# Altium footprint library G103WM_newLib.PcbLib: 75 footprints (part 4 of 5)
Each footprint in its own frame and in the unit in brackets; x right, y up, seen from the top. Pads: shape width x height; smd on the part's side, far side on the other; paste and mask are expansions set on the pad; w line width, h text height; cw(c..) or ccw(c..) is an arc to the next point about the centre after c.
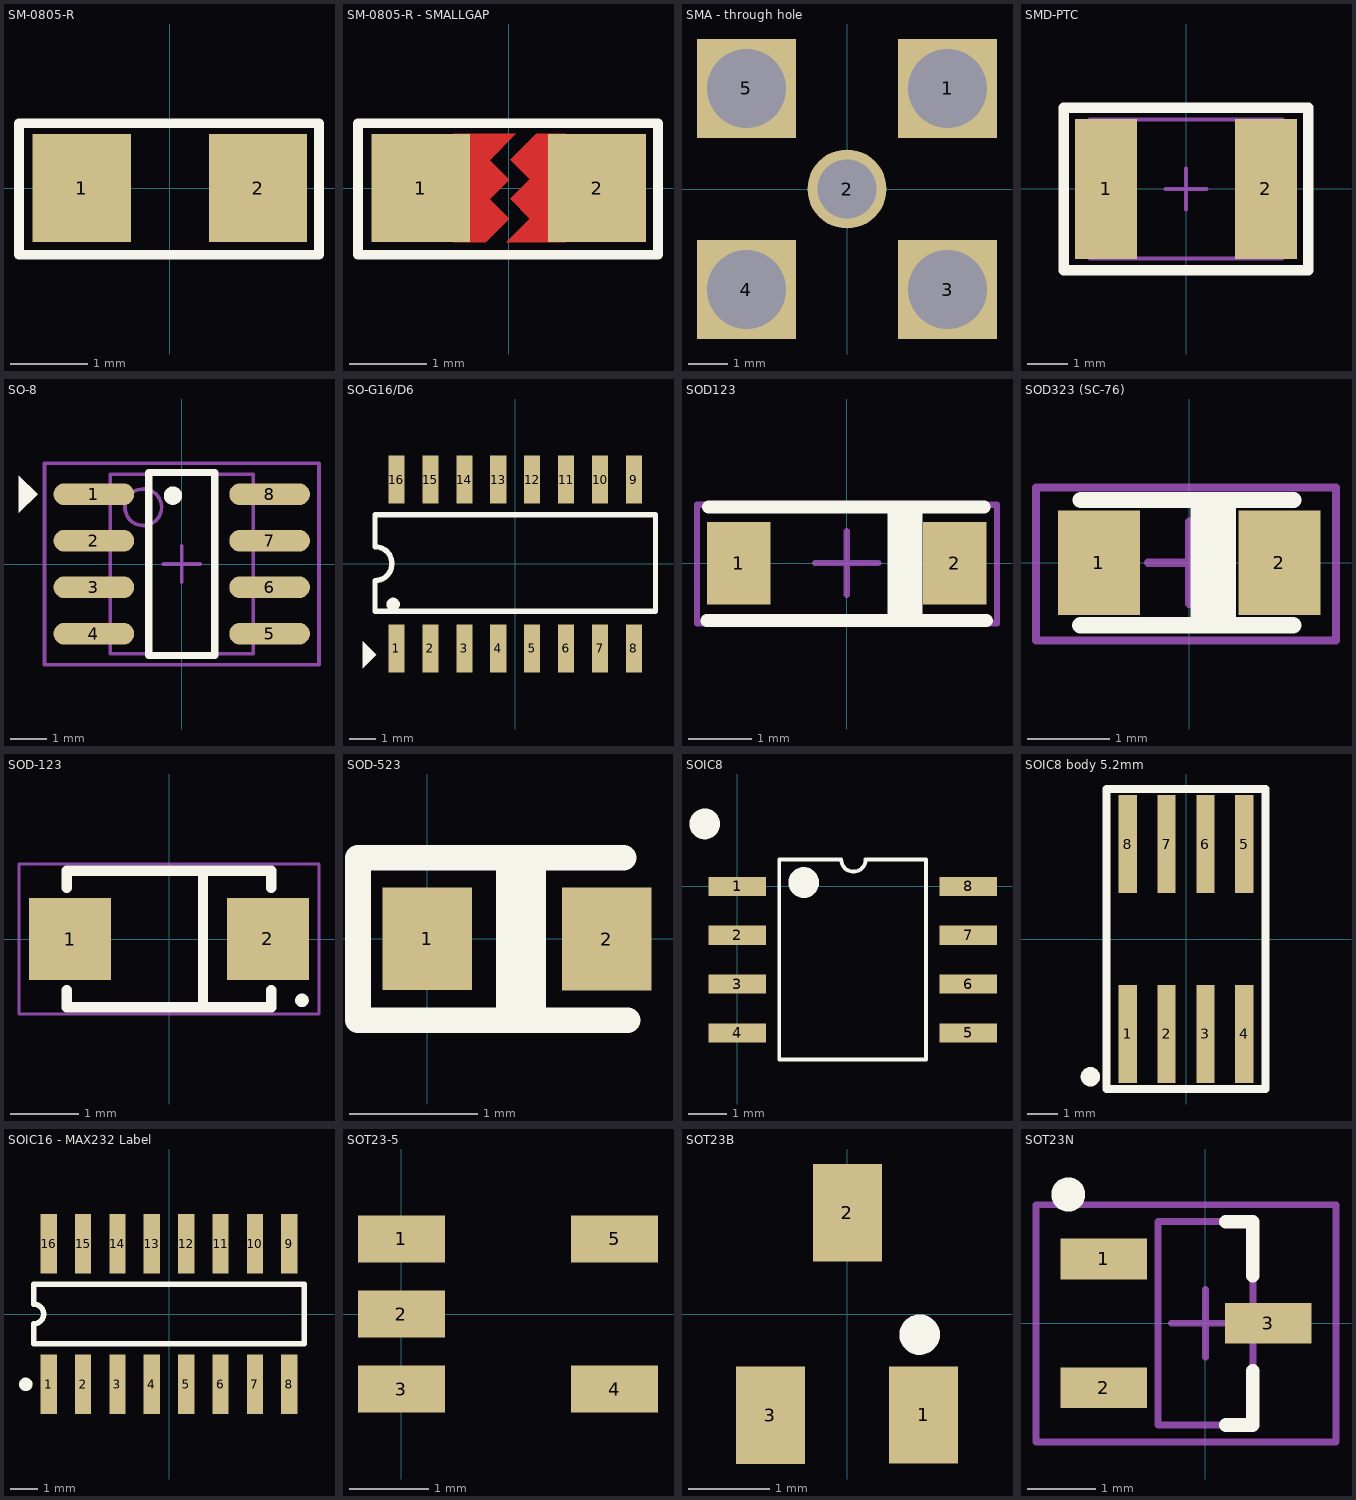
[diagram p3: the footprints below, top view; thin cyan lines are the x and y axes]

## SM-0805-R [mil] "Compoment SMD 80x50mil"
height 50
pads (2):
  rect 50x55 smd: 1(-45,0) 2(45,0)
Top Overlay:
  lines w5: -77,-34 -77,33 76,33 76,-34 -77,-34
3D body "User Library-0805 SMD Resistor.step": height 30.79, standoff 0, extent -39.36,-24.6 39.38,24.61

## SM-0805-R - SMALLGAP [mil] "Compoment SMD 80x50mil"
height 50
pads (2):
  rect 50x55 smd: 1(-45,0) 2(45,0)
Top Layer:
  region: -28.54,27.56 3.39,27.56 -9.92,14.25 0.08,4.25 -9.92,-5.75 0.08,-15.75 -11.73,-27.56 -28.54,-27.56
  region: 29,27.72 13.84,27.72 0.53,14.41 10.53,4.41 0.53,-5.59 10.53,-15.59 -1.44,-27.56 29,-27.56
Top Overlay:
  lines w5: -77,-34 76,-34 76,33 -77,33 -77,-34
3D body "User Library-0805 SMD Resistor.step": height 30.79, standoff 0, extent -39.36,-24.6 39.38,24.61

## SMA - through hole [mm]
pads (5):
  rect 2.5x2.5 hole 2: 1(2.54,2.54) 3(2.54,-2.54) 4(-2.54,-2.54) 5(-2.54,2.54)
  round 2 hole 1.5: 2(0,0)
3D body "SMA-J-P-H-ST-TH1.STEP": height 11.6, standoff -1.87, extent -3.444,-3.5 3.556,3.5

## SMD-PTC [mm]
height 0.7
pads (2):
  rect 1.52x3.44 smd: 1(-1.965,0) 2(1.965,0)
Top Overlay:
  lines w0.254: -3,-2 -3,2 3,2 3,-2 -3,-2
Mechanical 13:
  lines w0.1: -2.365,-1.705 -2.365,1.705 2.365,1.705 2.365,-1.705 -2.365,-1.705
Mechanical 15:
  lines w0.1: -0.5,0 0.5,0 ; 0,-0.5 0,0.5
3D body: height 0.7, standoff 0, extent -2.065,-1.705 2.065,1.705
3D body: height 0.7, standoff 0, extent -2.365,-1.705 -2.065,1.705
3D body: height 0.7, standoff 0, extent 2.065,-1.705 2.365,1.705

## SO-8 [mm] "8-Pin Small Outline Integrated Circuit 1.27 mm Pitch, IPC Medium Density"
height 1.75
pads (8):
  oval 2.2x0.6 smd: 1(-2.4,1.905) 2(-2.4,0.635) 3(-2.4,-0.635) 4(-2.4,-1.905) 5(2.4,-1.905) 6(2.4,-0.635) 7(2.4,0.635) 8(2.4,1.905)
Top Overlay:
  circle w0.25: c-0.241,1.866 r0.125
  region: -4.445,1.397 -3.937,1.905 -4.445,2.413
  lines w0.2: -0.9,-2.5 -0.9,2.5 0.9,2.5 0.9,-2.5 -0.9,-2.5
Mechanical 13:
  circle w0.1: c-1.05,1.55 r0.5
  lines w0.1: -1.95,-2.45 -1.95,2.45 1.95,2.45 1.95,-2.45 -1.95,-2.45
Mechanical 15:
  lines w0.1: -0.5,0 0.5,0 ; 0,-0.5 0,0.5 ; -3.75,-2.75 -3.75,2.75 3.75,2.75 3.75,-2.75 -3.75,-2.75
3D body "User Library-sop-8.STEP": height 1.6, standoff 0, extent -2.894,-2.51 3.148,2.51

## SO-G16/D6 [mm] "Small Outline; 16 Leads; Body Width 5.3 mm; Pitch 1.27 mm"
height 2
pads (16):
  rect 0.6x1.8 smd: 1(-4.445,-3.168) 2(-3.175,-3.168) 3(-1.905,-3.168) 4(-0.635,-3.168) 5(0.635,-3.168) 6(1.905,-3.168) 7(3.175,-3.168) 8(4.445,-3.168) 9(4.445,3.143) 10(3.175,3.143) 11(1.905,3.143) 12(0.635,3.143) 13(-0.635,3.143) 14(-1.905,3.143) 15(-3.175,3.143) 16(-4.445,3.143)
Top Overlay:
  circle w0.25: c-4.57,-1.524 r0.125
  region: -5.715,-3.912 -5.207,-3.404 -5.715,-2.896
  lines w0.2: -5.25,-1.778 5.25,-1.778 5.25,1.829 -5.25,1.829 -5.25,0.635 cw(c-5.25,0) -5.25,-0.635 -5.25,-1.778
3D body "User Library-so16-1.step": height 1.76, standoff 0, extent -4.985,-3.068 4.985,3.069

## SOD123 [mm] "SOD123, 2-Leads, Body 3.85x1.7mm"
height 1.25
pads (2):
  rect 1x1.3 smd: 1(-1.7,0) 2(1.7,0)
Top Overlay:
  rectangle: 0.641,-0.89 1.191,0.885
  lines w0.2: -2.177,0.882 2.168,0.882
  lines w0.203: -2.206,-0.907 2.199,-0.907
Mechanical 15:
  lines w0.1: -0.5,0 0.5,0 ; 0,-0.5 0,0.5 ; -2.359,-0.947 2.366,-0.947 2.366,0.917 -2.359,0.917 -2.359,-0.947
3D body "SOD123.STEP": height 1.35, standoff 0, extent -2.016,-0.782 1.684,0.767

## SOD323 (SC-76) [mm] "SOD323 (SC-76), 2-Leads, Body 2.7x1.35mm"
height 1.1
pads (2):
  rect 1x1.27 smd: 1(-1.1,0) 2(1.1,0)
Top Overlay:
  rectangle: 0.019,-0.762 0.569,0.713
  lines w0.2: -1.321,0.766 1.274,0.766
  lines w0.203: -1.325,-0.764 1.27,-0.764
Mechanical 13:
  text ".Designator" at -1.524,-0.635 h2.03
Mechanical 15:
  lines w0.1: -0.5,0 0.5,0 ; 0,-0.5 0,0.5 ; -1.868,-0.947 1.792,-0.947 1.792,0.917 -1.868,0.917 -1.868,-0.947
3D body "SOD323.STEP": height 0.9, standoff -0.09, extent -1.243,-0.663 1.257,0.587

## SOD-123 [mm]
height 1.1
pads (2):
  rect 1.2x1.2 smd: 1(-1.45,0) 2(1.45,0)
Top Overlay:
  circle w0.1: c1.95,-0.9 r0.05
  lines w0.15: -1.5,-0.75 -1.5,-1 1.5,-1 1.5,-0.75 ; -1.5,0.75 -1.5,1 1.5,1 1.5,0.75 ; 0.5,-1 0.5,1
Mechanical 15:
  lines w0.05: -2.2,-1.1 2.2,-1.1 2.2,1.1 -2.2,1.1 -2.2,-1.1
3D body "User Library-SOD3716X14.step": height 1.35, standoff 0, extent -1.85,-0.775 1.85,0.775

## SOD-523 [mm] "Small and Thin SMD package 2mmx1mm"
height 1
pads (2):
  rect 0.7x0.8 smd: 1(0,0) 2(1.4,-0.003)
Top Overlay:
  lines w0.2: 1.533,0.632 -0.541,0.632 -0.541,-0.637 1.562,-0.637
  lines w0.254: 0.662,-0.578 0.662,0.558 ; 0.798,-0.589 0.798,0.514

## SOIC8 [mm]
pads (8):
  rect 1.5x0.5 smd: 1(0,0) 2(0,-1.27) 3(0,-2.54) 4(0,-3.81) 5(6,-3.81) 6(6,-2.54) 7(6,-1.27) 8(6,0)
Top Overlay:
  circle w0.4: c-0.85,1.625 r0.2
  circle w0.4: c1.725,0.1 r0.2
  lines w0.1: 1.09,-4.5 1.09,0.7 ; 1.1,-4.5 4.9,-4.5 4.9,0.7 3.335,0.7 cw(c3.017,0.7) 2.7,0.7 1.1,0.7
Mechanical 13:
  text ".Designator" at 3.531,-4.216 h0.81
3D body "SOIC8.STEP": height 1.7, standoff 0, extent -0.079,-4.392 5.921,0.508

## SOIC8 body 5.2mm [mm] "Small Outline; 8 Leads; Body Width 5.2 mm; Pitch 1.27 mm"
pads (8):
  rect 0.6x3.2 smd: 1(-1.905,-3.1) 2(-0.635,-3.1) 3(0.635,-3.1) 4(1.905,-3.1) 5(1.905,3.1) 6(0.635,3.1) 7(-0.635,3.1) 8(-1.905,3.1)
Top Overlay:
  circle w0.381: c-3.125,-4.5 r0.125
  lines w0.254: -2.6,-4.9 2.6,-4.9 2.6,4.9 -2.6,4.9 -2.6,-4.9
Mechanical 13:
  text ".Designator" at -2.438,-0.61 h2.03
3D body "SOIC8_body5mm.STEP": height 1.7, standoff 0, extent -2.426,-4.089 2.4,4.089

## SOIC16 - MAX232 Label [mm] "Small Outline; 16 Leads; Body Width 3.5 mm; Pitch 1.27 mm"
pads (16):
  rect 0.6x2.2 smd: 1(-4.445,-2.6) 2(-3.175,-2.6) 3(-1.905,-2.6) 4(-0.635,-2.6) 5(0.635,-2.6) 6(1.905,-2.6) 7(3.175,-2.6) 8(4.445,-2.6) 9(4.445,2.6) 10(3.175,2.6) 11(1.905,2.6) 12(0.635,2.6) 13(-0.635,2.6) 14(-1.905,2.6) 15(-3.175,2.6) 16(-4.445,2.6)
Top Overlay:
  circle w0.25: c-5.295,-2.6 r0.125
  lines w0.2: -5,-1.1 5,-1.1 5,1.1 -5,1.1 -5,0.367 cw(c-5,0) -5,-0.367 -5,-1.1
Mechanical 13:
  text ".Designator" at -3.581,-0.61 h0.81
3D body: height 0.25, standoff 0.01, extent -3.425,-3.125 -2.925,-2.025
3D body: height 0.25, standoff 0.01, extent -4.7,-3.1 -4.2,-2
3D body: height 0.25, standoff 0.01, extent -0.875,-3.125 -0.375,-2.025
3D body: height 0.25, standoff 0.01, extent -2.15,-3.1 -1.65,-2
3D body: height 0.25, standoff 0.01, extent 1.65,-3.1 2.15,-2
3D body: height 0.25, standoff 0.01, extent 0.375,-3.075 0.875,-1.975
3D body: height 0.25, standoff 0.01, extent 4.2,-3.125 4.7,-2.025
3D body: height 0.25, standoff 0.01, extent 2.925,-3.1 3.425,-2
3D body: height 0.25, standoff 0.01, extent 2.925,2.025 3.425,3.125
3D body: height 0.25, standoff 0.01, extent 4.2,2 4.7,3.1
3D body: height 0.25, standoff 0.01, extent 0.375,2.025 0.875,3.125
3D body: height 0.25, standoff 0.01, extent 1.65,2 2.15,3.1
3D body: height 0.25, standoff 0.01, extent -2.15,2.025 -1.65,3.125
3D body: height 0.25, standoff 0.01, extent -0.875,2 -0.375,3.1
3D body: height 0.25, standoff 0.01, extent -3.425,2 -2.925,3.1
3D body: height 0.25, standoff 0.01, extent -4.7,2.025 -4.2,3.125
3D body: height 1.76, standoff 1.74, extent -4.5,-1.575 -3.7,-0.8
3D body: height 1.75, standoff 0.25, extent -4.996,-2 5.004,2
3D body: height 1.76, standoff 1.74, extent 1.425,-0.55 2.425,0.825
3D body: height 1.76, standoff 1.74, extent 2.625,-0.55 3.625,0.825
3D body: height 1.76, standoff 1.74, extent 0.225,-0.55 1.225,0.825
3D body: height 1.76, standoff 1.74, extent -0.975,-0.525 0.025,0.8
3D body: height 1.76, standoff 1.74, extent -2,0.05 -1.35,0.25
3D body: height 1.76, standoff 1.74, extent -2.175,-0.525 -1.175,0.8
3D body: height 1.76, standoff 1.74, extent -3.375,-0.525 -2.375,0.8

## SOT23-5 [mm]
pads (5):
  rect 1.1x0.6 smd: 1(0,0.95) 2(0,0) 3(0,-0.95) 4(2.7,-0.95) 5(2.7,0.95)
3D body "SOT-23-5.STEP": height 1.05, standoff -0.05, extent 0.1,-1.5 2.6,1.5

## SOT23B [mm] "SOT 23B"
height 1.27
pads (3):
  rect 0.85x1.2 smd: 1(0.94,-1.245) 2(0,1.25) 3(-0.95,-1.25)
Top Overlay:
  circle w0.25: c0.891,-0.254 r0.125
3D body "SW3DPS-SOT-23-DEFAULT.STEP": height 1.06, standoff -0.04, extent -1.5,-1.301 1.5,1.199

## SOT23N [mm] "SOT23, 3-Leads, Body 3.0x2.6mm (max), Pitch 0.95mm, IPC Medium Density"
height 1.1
pads (3):
  rect 1.27x0.6 smd: 1(-1.5,0.95) 2(-1.5,-0.95) 3(0.925,0)
Top Overlay:
  circle w0.25: c-2.025,1.9 r0.125
  lines w0.2: 0.3,-1.5 0.7,-1.5 0.7,-0.7 ; 0.3,1.5 0.7,1.5 0.7,0.7
Mechanical 13:
  lines w0.1: -0.7,-1.5 0.7,-1.5 0.7,1.5 -0.7,1.5 -0.7,-1.5
Mechanical 15:
  lines w0.1: -0.5,0 0.5,0 ; 0,-0.5 0,0.5 ; -2.5,-1.75 1.925,-1.75 1.925,1.75 -2.5,1.75 -2.5,-1.75
3D body "SOT-23.STEP": height 1.05, standoff -0.05, extent -1.27,-1.5 1.23,1.5